# Altium footprint library connectors_USB_ETH.PcbLib: 71 footprints (part 1 of 5)
Each footprint in its own frame and in the unit in brackets; x right, y up, seen from the top. Pads: shape width x height; smd on the part's side, far side on the other; paste and mask are expansions set on the pad; w line width, h text height; cw(c..) or ccw(c..) is an arc to the next point about the centre after c.
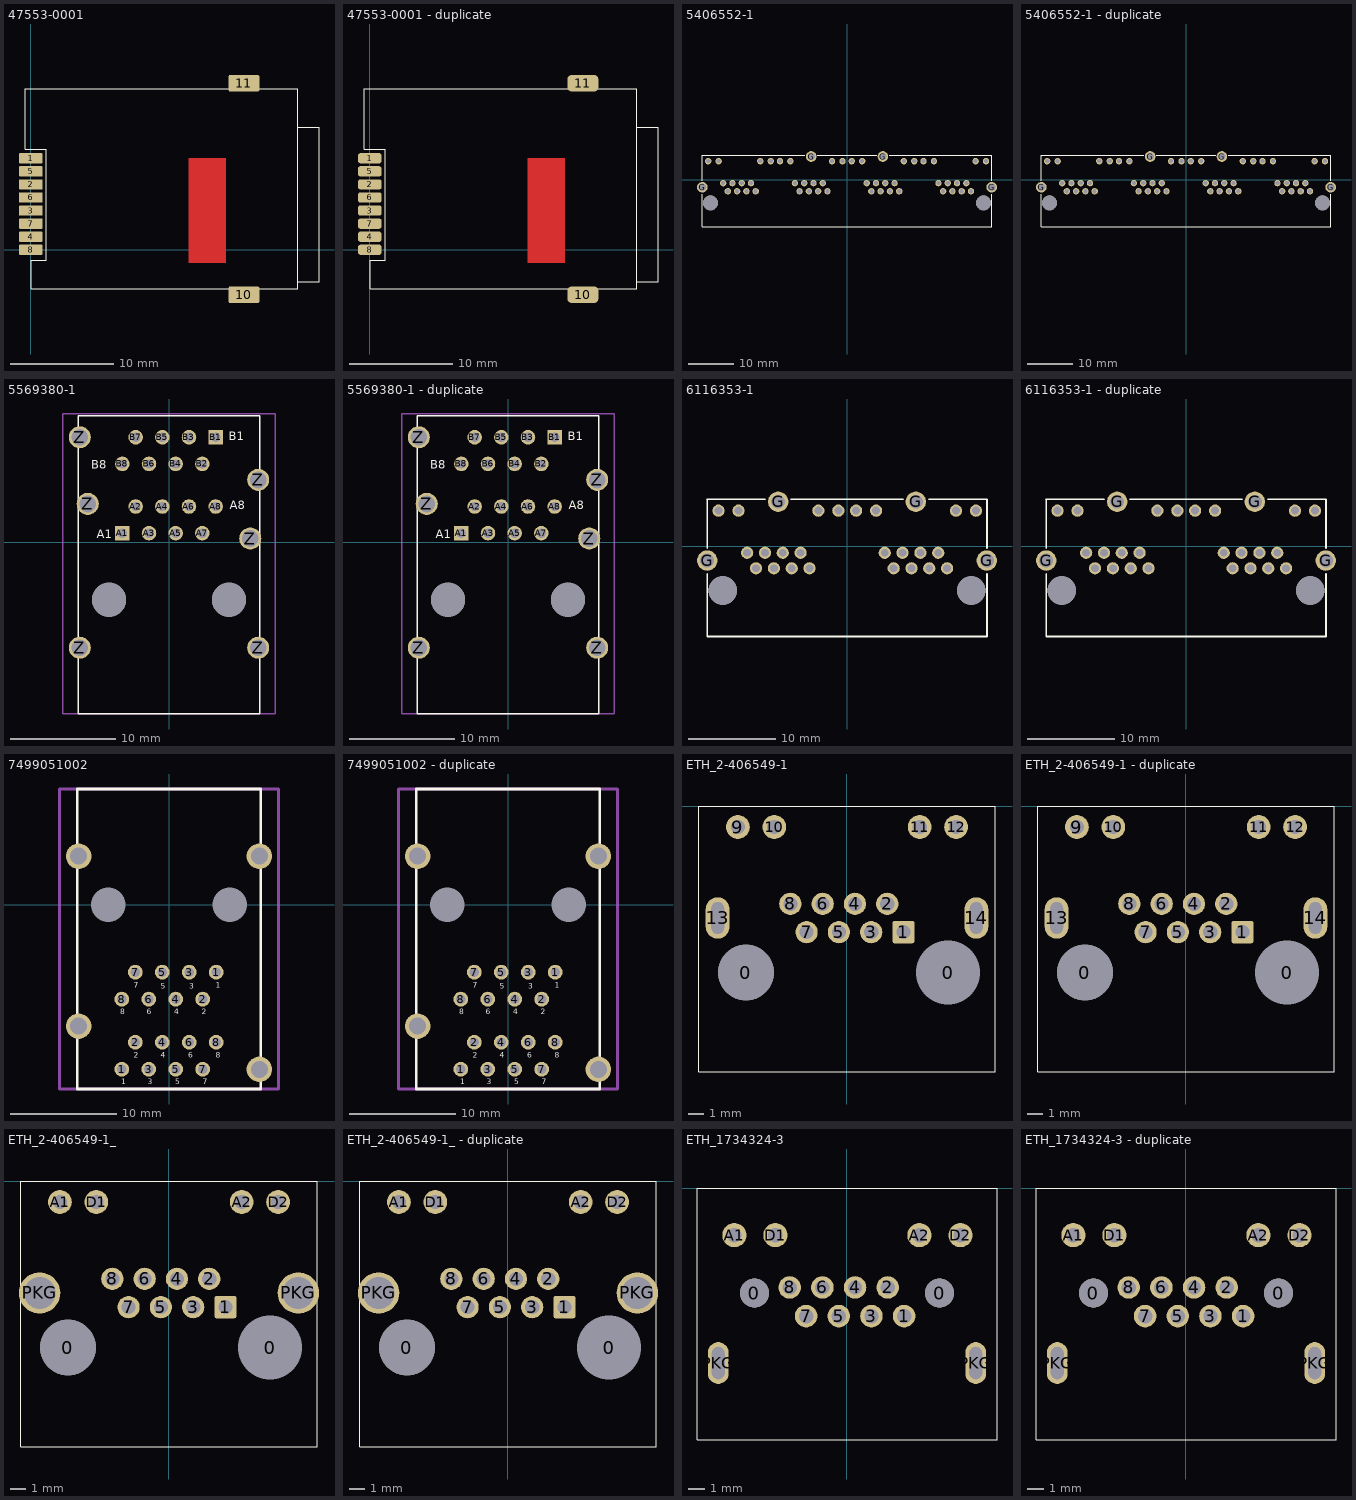
[diagram p0: the footprints below, top view; thin cyan lines are the x and y axes]

## 47553-0001 [mm]
pads (10):
  rrect20% 2.3x1 smd: 1(0,8.89) 2(0,6.35) 3(0,3.81) 4(0,1.27) 5(0,7.62) 6(0,5.08) 7(0,2.54) 8(0,0)
  rrect20% 3x1.6 smd: 10(20.7,-4.37) 11(20.7,16.18)
Top Layer:
  region: 15.367,-1.27 18.923,-1.27 18.923,8.89 15.367,8.89
Top Overlay:
  lines w0.1: 25.95,-3.1 28,-3.1 28,11.9 25.95,11.9 ; -0.55,9.75 1.5,9.75 1.5,-1 0.05,-1 0.05,-3.775 25.95,-3.775 25.95,15.65 -0.55,15.65 -0.55,9.75
3D body "SIM card.STEP": height 1.6, standoff 0.8, extent 3,-3.1 28,11.9
3D body "475530001.stp": height 1.84, standoff 0.01, extent -0.55,-4.525 25.95,16.425

## 47553-0001 - duplicate [mm]
pads (10):
  rrect50% 2.3x1 smd: 1(0,8.89) 2(0,6.35) 3(0,3.81) 4(0,1.27) 5(0,7.62) 6(0,5.08) 7(0,2.54) 8(0,0)
  rrect50% 3x1.6 smd: 10(20.7,-4.37) 11(20.7,16.18)
Top Layer:
  region: 15.367,-1.27 18.923,-1.27 18.923,8.89 15.367,8.89
Top Overlay:
  lines w0.1: 25.95,-3.1 28,-3.1 28,11.9 25.95,11.9 ; -0.55,9.75 -0.55,15.65 25.95,15.65 25.95,-3.775 0.05,-3.775 0.05,-1 1.5,-1 1.5,9.75 -0.55,9.75
3D body "475530001.stp": height 1.84, standoff 0.01, extent -0.55,-4.525 25.95,16.425
3D body "SIM card.STEP": height 1.6, standoff 0.8, extent 3,-3.1 28,11.9

## 5406552-1 [mm]
height 0.025
pads (54):
  round 1.4 hole 0.9 mask+0.127: 1_1(-20.04,-2.54) 1_2(-21.06,-0.76) 1_3(-22.08,-2.54) 1_4(-23.1,-0.76) 1_5(-24.12,-2.54) 1_6(-25.14,-0.76) 1_7(-26.16,-2.54) 1_8(-27.18,-0.76) 2_1(-4.29,-2.54) 2_2(-5.31,-0.76) 2_3(-6.33,-2.54) 2_4(-7.35,-0.76) 2_5(-8.37,-2.54) 2_6(-9.39,-0.76) 2_7(-10.41,-2.54) 2_8(-11.43,-0.76) 3_1(11.46,-2.54) 3_2(10.44,-0.76) 3_3(9.42,-2.54) 3_4(8.4,-0.76) 3_5(7.38,-2.54) 3_6(6.36,-0.76) 3_7(5.34,-2.54) 3_8(4.32,-0.76) 4_1(27.21,-2.54) 4_2(26.19,-0.76) 4_3(25.17,-2.54) 4_4(24.15,-0.76) 4_5(23.13,-2.54) 4_6(22.11,-0.76) 4_7(21.09,-2.54) 4_8(20.07,-0.76) GA1(-19.03,4.06) GA2(-3.28,4.06) GA3(12.47,4.06) GA4(28.22,4.06) GC1(-16.74,4.06) GC2(-0.99,4.06) GC3(14.76,4.06) GC4(30.51,4.06) YA1(-30.46,4.06) YA2(-14.71,4.06) YA3(1.04,4.06) YA4(16.79,4.06) YC1(-28.17,4.06) YC2(-12.42,4.06) YC3(3.33,4.06) YC4(19.08,4.06)
  round 2.337 hole 1.6 mask+0.102: G(-31.75,-1.65) G(-7.87,5.08) G(7.88,5.08) G(31.75,-1.65)
  round 3.251 / inner round 3.759 / far side round 3.251 hole 3.3 unplated: ""(-29.97,-5.08) ""(29.97,-5.08)
Top Overlay:
  lines w0.2: -31.74,-3.175 -31.74,-10.34 31.76,-10.34 31.76,-3.175 ; -31.74,-0.254 -31.74,5.36 -9.24,5.36 ; -6.54,5.38 6.56,5.38 ; 9.23,5.38 31.76,5.38 31.76,-0.254
3D body "4way_led-5406552-1-f-3d.stp": height 14.51, standoff -4.13, extent -32.965,-11.35 32.993,5.37

## 5406552-1 - duplicate [mm]
height 0.025
pads (54):
  round 1.4 hole 0.9 mask+0.127: 1_1(-20.04,-2.54) 1_2(-21.06,-0.76) 1_3(-22.08,-2.54) 1_4(-23.1,-0.76) 1_5(-24.12,-2.54) 1_6(-25.14,-0.76) 1_7(-26.16,-2.54) 1_8(-27.18,-0.76) 2_1(-4.29,-2.54) 2_2(-5.31,-0.76) 2_3(-6.33,-2.54) 2_4(-7.35,-0.76) 2_5(-8.37,-2.54) 2_6(-9.39,-0.76) 2_7(-10.41,-2.54) 2_8(-11.43,-0.76) 3_1(11.46,-2.54) 3_2(10.44,-0.76) 3_3(9.42,-2.54) 3_4(8.4,-0.76) 3_5(7.38,-2.54) 3_6(6.36,-0.76) 3_7(5.34,-2.54) 3_8(4.32,-0.76) 4_1(27.21,-2.54) 4_2(26.19,-0.76) 4_3(25.17,-2.54) 4_4(24.15,-0.76) 4_5(23.13,-2.54) 4_6(22.11,-0.76) 4_7(21.09,-2.54) 4_8(20.07,-0.76) GA1(-19.03,4.06) GA2(-3.28,4.06) GA3(12.47,4.06) GA4(28.22,4.06) GC1(-16.74,4.06) GC2(-0.99,4.06) GC3(14.76,4.06) GC4(30.51,4.06) YA1(-30.46,4.06) YA2(-14.71,4.06) YA3(1.04,4.06) YA4(16.79,4.06) YC1(-28.17,4.06) YC2(-12.42,4.06) YC3(3.33,4.06) YC4(19.08,4.06)
  round 2.337 hole 1.6 mask+0.102: G(-31.75,-1.65) G(-7.87,5.08) G(7.88,5.08) G(31.75,-1.65)
  round 3.251 / inner round 3.759 / far side round 3.251 hole 3.3 unplated: ""(-29.97,-5.08) ""(29.97,-5.08)
Top Overlay:
  lines w0.2: -31.74,-3.175 -31.74,-10.34 31.76,-10.34 31.76,-3.175 ; -31.74,-0.254 -31.74,5.36 -9.24,5.36 ; -6.54,5.38 6.56,5.38 ; 9.23,5.38 31.76,5.38 31.76,-0.254
3D body "4way_led-5406552-1-f-3d.stp": height 14.51, standoff -4.13, extent -32.965,-11.35 32.993,5.37

## 5569380-1 [mm] "Horizontal Shielded 2x1 TH  EMI  fingers  8P8C Tab Down & Up"
height 25.2
pads (24):
  rect 1.39x1.39 hole 0.89: A1(-4.445,0.89) B1(4.445,10.03)
  round 1.39 hole 0.89: A2(-3.175,3.43) A3(-1.905,0.89) A4(-0.635,3.43) A5(0.635,0.89) A6(1.905,3.43) A7(3.175,0.89) A8(4.445,3.43) B2(3.175,7.49) B3(1.905,10.03) B4(0.635,7.49) B5(-0.635,10.03) B6(-1.905,7.49) B7(-3.175,10.03) B8(-4.445,7.49)
  round 2.1 hole 1.6: Z(-8.505,-10.03) Z(-8.505,10.03) Z(-7.745,3.68) Z(7.745,0.38) Z(8.505,-10.03) Z(8.505,5.97)
  round 3.25 hole 3.25 unplated: ""(-5.715,-5.46) ""(5.715,-5.46)
Top Overlay:
  lines w0.127: -8.635,-16.35 -8.635,12.1 8.635,12.1 8.635,-16.35 -8.635,-16.35
  text "B8" at -7.4,7.025 h0.8
  text "B1" at 5.675,9.75 h0.8
  text "A8" at 5.8,3.15 h0.8
  text "A1" at -6.875,0.425 h0.8
Mechanical 15:
  lines w0.127: -10.136,-16.35 -10.136,12.25 10.136,12.25 10.136,-16.35 -10.136,-16.35
3D body "c-5569380-1-a1-3d.stp": height 25.39, standoff -4.07, extent -8.636,-16.248 8.636,12.2

## 5569380-1 - duplicate [mm] "Horizontal Shielded 2x1 TH  EMI  fingers  8P8C Tab Down & Up"
height 25.2
pads (24):
  rect 1.39x1.39 hole 0.89: A1(-4.445,0.89) B1(4.445,10.03)
  round 1.39 hole 0.89: A2(-3.175,3.43) A3(-1.905,0.89) A4(-0.635,3.43) A5(0.635,0.89) A6(1.905,3.43) A7(3.175,0.89) A8(4.445,3.43) B2(3.175,7.49) B3(1.905,10.03) B4(0.635,7.49) B5(-0.635,10.03) B6(-1.905,7.49) B7(-3.175,10.03) B8(-4.445,7.49)
  round 2.1 hole 1.6: Z(-8.505,-10.03) Z(-8.505,10.03) Z(-7.745,3.68) Z(7.745,0.38) Z(8.505,-10.03) Z(8.505,5.97)
  round 3.25 hole 3.25 unplated: ""(-5.715,-5.46) ""(5.715,-5.46)
Top Overlay:
  lines w0.127: -8.635,-16.35 -8.635,12.1 8.635,12.1 8.635,-16.35 -8.635,-16.35
  text "B8" at -7.4,7.025 h0.8
  text "B1" at 5.675,9.75 h0.8
  text "A8" at 5.8,3.15 h0.8
  text "A1" at -6.875,0.425 h0.8
Mechanical 15:
  lines w0.127: -10.136,-16.35 -10.136,12.25 10.136,12.25 10.136,-16.35 -10.136,-16.35
3D body "c-5569380-1-a1-3d.stp": height 25.39, standoff -4.07, extent -8.636,-16.248 8.636,12.2

## 6116353-1 [mm]
height 0.025
pads (30):
  round 1.4 hole 0.9 mask+0.127: 1_1(-4.29,-2.5) 1_2(-5.31,-0.72) 1_3(-6.33,-2.5) 1_4(-7.35,-0.72) 1_5(-8.37,-2.5) 1_6(-9.39,-0.72) 1_7(-10.41,-2.5) 1_8(-11.43,-0.72) 2_1(11.46,-2.5) 2_2(10.44,-0.72) 2_3(9.42,-2.5) 2_4(8.4,-0.72) 2_5(7.38,-2.5) 2_6(6.36,-0.72) 2_7(5.34,-2.5) 2_8(4.32,-0.72) GA1(-3.28,4.1) GA2(12.47,4.1) GC1(-0.99,4.1) GC2(14.76,4.1) YA1(-14.71,4.1) YA2(1.04,4.1) YC1(-12.42,4.1) YC2(3.33,4.1)
  round 2.337 hole 1.6 mask+0.102: G(-16,-1.61) G(-7.875,5.12) G(7.875,5.12) G(16,-1.61)
  round 3.251 / inner round 3.759 / far side round 3.251 hole 3.3 unplated: ""(-14.225,-5.04) ""(14.225,-5.04)
Top Overlay:
  lines w0.2: -16.01,5.4 -9.35,5.4 ; -15.99,-3.135 -15.99,-10.3 16.01,-10.3 16.01,-3.135 ; -15.99,-0.214 -15.99,5.4 ; -6.4,5.4 6.4,5.4 ; 9.35,5.4 16.01,5.4 16.01,-0.214
3D body "2way_led_6116353-1-d-3d.stp": height 14.66, standoff -4.06, extent -17.321,-11.321 17.321,5.4

## 6116353-1 - duplicate [mm]
height 0.025
pads (30):
  round 1.4 hole 0.9 mask+0.127: 1_1(-4.29,-2.5) 1_2(-5.31,-0.72) 1_3(-6.33,-2.5) 1_4(-7.35,-0.72) 1_5(-8.37,-2.5) 1_6(-9.39,-0.72) 1_7(-10.41,-2.5) 1_8(-11.43,-0.72) 2_1(11.46,-2.5) 2_2(10.44,-0.72) 2_3(9.42,-2.5) 2_4(8.4,-0.72) 2_5(7.38,-2.5) 2_6(6.36,-0.72) 2_7(5.34,-2.5) 2_8(4.32,-0.72) GA1(-3.28,4.1) GA2(12.47,4.1) GC1(-0.99,4.1) GC2(14.76,4.1) YA1(-14.71,4.1) YA2(1.04,4.1) YC1(-12.42,4.1) YC2(3.33,4.1)
  round 2.337 hole 1.6 mask+0.102: G(-16,-1.61) G(-7.875,5.12) G(7.875,5.12) G(16,-1.61)
  round 3.251 / inner round 3.759 / far side round 3.251 hole 3.3 unplated: ""(-14.225,-5.04) ""(14.225,-5.04)
Top Overlay:
  lines w0.2: -16.01,5.4 -9.35,5.4 ; -15.99,-3.135 -15.99,-10.3 16.01,-10.3 16.01,-3.135 ; -15.99,-0.214 -15.99,5.4 ; -6.4,5.4 6.4,5.4 ; 9.35,5.4 16.01,5.4 16.01,-0.214
3D body "2way_led_6116353-1-d-3d.stp": height 14.66, standoff -4.06, extent -17.321,-11.321 17.321,5.4

## 7499051002 [mm] "RJ45 LAN Transformer, 10/100/1000 Base-T Multiport & USB"
height 25.2
pads (22):
  round 1.4 hole 0.89: 1(-4.445,-15.49) 1(4.445,-6.35) 2(-3.175,-12.95) 2(3.175,-8.89) 3(-1.905,-15.49) 3(1.905,-6.35) 4(-0.635,-12.95) 4(0.635,-8.89) 5(-0.635,-6.35) 5(0.635,-15.49) 6(-1.905,-8.89) 6(1.905,-12.95) 7(-3.175,-6.35) 7(3.175,-15.49) 8(-4.445,-8.89) 8(4.445,-12.95)
  round 2.4 hole 1.6: ""(-8.51,-11.43) ""(-8.51,4.57) ""(8.51,-15.5) ""(8.51,4.57)
  rect 0x0 hole 3.25 unplated: ""(-5.715,0) ""(5.715,0)
Top Overlay:
  lines w0.254: -8.635,-17.35 8.635,-17.35 8.635,10.9 -8.635,10.9 -8.635,-17.35
  text "8" at 4.4,-14.4 h0.5
  text "8" at -4.6,-10.3 h0.5
  text "7" at 3.2,-16.9 h0.5
  text "7" at -3.3,-7.8 h0.5
  text "6" at 1.8,-14.4 h0.5
  text "6" at -2.1,-10.3 h0.5
  text "5" at 0.6,-16.9 h0.5
  text "5" at -0.8,-7.9 h0.5
  text "4" at -0.8,-14.4 h0.5
  text "4" at 0.5,-10.3 h0.5
  text "3" at -2,-16.9 h0.5
  text "3" at 1.9,-7.9 h0.5
  text "2" at -3.3,-14.4 h0.5
  text "2" at 3.1,-10.3 h0.5
  text "1" at -4.5,-16.9 h0.5
  text "1" at 4.4,-7.8 h0.5
Mechanical 15:
  lines w0.254: -10.306,-17.35 10.306,-17.35 10.306,10.9 -10.306,10.9 -10.306,-17.35
3D body "7499051002.stp": height 26.77, standoff -3.66, extent -10.271,-17.2 10.271,10.8

## 7499051002 - duplicate [mm] "RJ45 LAN Transformer, 10/100/1000 Base-T Multiport & USB"
height 25.2
pads (22):
  round 1.4 hole 0.89: 1(-4.445,-15.49) 1(4.445,-6.35) 2(-3.175,-12.95) 2(3.175,-8.89) 3(-1.905,-15.49) 3(1.905,-6.35) 4(-0.635,-12.95) 4(0.635,-8.89) 5(-0.635,-6.35) 5(0.635,-15.49) 6(-1.905,-8.89) 6(1.905,-12.95) 7(-3.175,-6.35) 7(3.175,-15.49) 8(-4.445,-8.89) 8(4.445,-12.95)
  round 2.4 hole 1.6: ""(-8.51,-11.43) ""(-8.51,4.57) ""(8.51,-15.5) ""(8.51,4.57)
  rect 0x0 hole 3.25 unplated: ""(-5.715,0) ""(5.715,0)
Top Overlay:
  lines w0.254: -8.635,-17.35 8.635,-17.35 8.635,10.9 -8.635,10.9 -8.635,-17.35
  text "8" at 4.4,-14.4 h0.5
  text "8" at -4.6,-10.3 h0.5
  text "7" at 3.2,-16.9 h0.5
  text "7" at -3.3,-7.8 h0.5
  text "6" at 1.8,-14.4 h0.5
  text "6" at -2.1,-10.3 h0.5
  text "5" at 0.6,-16.9 h0.5
  text "5" at -0.8,-7.9 h0.5
  text "4" at -0.8,-14.4 h0.5
  text "4" at 0.5,-10.3 h0.5
  text "3" at -2,-16.9 h0.5
  text "3" at 1.9,-7.9 h0.5
  text "2" at -3.3,-14.4 h0.5
  text "2" at 3.1,-10.3 h0.5
  text "1" at -4.5,-16.9 h0.5
  text "1" at 4.4,-7.8 h0.5
Mechanical 15:
  lines w0.254: -10.306,-17.35 10.306,-17.35 10.306,10.9 -10.306,10.9 -10.306,-17.35
3D body "7499051002.stp": height 26.77, standoff -3.66, extent -10.271,-17.2 10.271,10.8

## ETH_2-406549-1 [mm] "2-406549-1, 2-406549-4"
pads (16):
  round 3.5 hole 3.5: 0(-6.35,-10.47)
  round 3.5 hole 4: 0(6.35,-10.47)
  rrect20% 1.4x1.4 hole 0.89: 1(3.55,-7.93)
  round 1.4 hole 0.89: 2(2.53,-6.15) 3(1.52,-7.93) 4(0.5,-6.15) 5(-0.51,-7.93) 6(-1.53,-6.15) 7(-2.54,-7.93) 8(-3.56,-6.15)
  round 1.5 hole 0.89: 9(-6.86,-1.32) 10(-4.57,-1.32) 11(4.57,-1.32) 12(6.86,-1.32)
  oval 1.5x2.6 hole 0.8 slot 2 at 90 deg: 13(-8.13,-7.04) 14(8.13,-7.04)
Top Overlay:
  lines w0.05: -9.322,-16.721 -9.322,0 9.322,0 9.322,-16.721 -9.322,-16.721
3D body "c-2-406549-1-r1-3d.stp": height 14.7, standoff -4.02, extent -9.322,-16.721 9.322,0

## ETH_2-406549-1 - duplicate [mm] "2-406549-1, 2-406549-4"
pads (16):
  round 3.5 hole 3.5: 0(-6.35,-10.47)
  round 3.5 hole 4: 0(6.35,-10.47)
  rrect20% 1.4x1.4 hole 0.89: 1(3.55,-7.93)
  round 1.4 hole 0.89: 2(2.53,-6.15) 3(1.52,-7.93) 4(0.5,-6.15) 5(-0.51,-7.93) 6(-1.53,-6.15) 7(-2.54,-7.93) 8(-3.56,-6.15)
  round 1.5 hole 0.89: 9(-6.86,-1.32) 10(-4.57,-1.32) 11(4.57,-1.32) 12(6.86,-1.32)
  oval 1.5x2.6 hole 0.8 slot 2 at 90 deg: 13(-8.13,-7.04) 14(8.13,-7.04)
Top Overlay:
  lines w0.05: -9.322,-16.721 9.322,-16.721 9.322,0 -9.322,0 -9.322,-16.721
3D body "c-2-406549-1-r1-3d.stp": height 14.7, standoff -4.02, extent -9.322,-16.721 9.322,0

## ETH_2-406549-1_ [mm] "2-406549-1, 2-406549-4"
pads (16):
  round 3.5 hole 3.5: 0(-6.35,-10.47)
  round 3.5 hole 4: 0(6.35,-10.47)
  rrect20% 1.4x1.4 hole 0.89: 1(3.55,-7.93)
  round 1.4 hole 0.89: 2(2.53,-6.15) 3(1.52,-7.93) 4(0.5,-6.15) 5(-0.51,-7.93) 6(-1.53,-6.15) 7(-2.54,-7.93) 8(-3.56,-6.15)
  round 1.5 hole 0.89: A1(-6.86,-1.32) A2(4.57,-1.32) D1(-4.57,-1.32) D2(6.86,-1.32)
  round 2.6 hole 2: PKG(-8.13,-7.04) PKG(8.13,-7.04)
Top Overlay:
  lines w0.05: -9.322,-16.721 -9.322,0 9.322,0 9.322,-16.721 -9.322,-16.721
3D body "c-2-406549-1-r1-3d.stp": height 14.7, standoff -4.02, extent -9.322,-16.721 9.322,0

## ETH_2-406549-1_ - duplicate [mm] "2-406549-1, 2-406549-4"
pads (16):
  round 3.5 hole 3.5: 0(-6.35,-10.47)
  round 3.5 hole 4: 0(6.35,-10.47)
  rrect20% 1.4x1.4 hole 0.89: 1(3.55,-7.93)
  round 1.4 hole 0.89: 2(2.53,-6.15) 3(1.52,-7.93) 4(0.5,-6.15) 5(-0.51,-7.93) 6(-1.53,-6.15) 7(-2.54,-7.93) 8(-3.56,-6.15)
  round 1.5 hole 0.89: A1(-6.86,-1.32) A2(4.57,-1.32) D1(-4.57,-1.32) D2(6.86,-1.32)
  round 2.6 hole 2: PKG(-8.13,-7.04) PKG(8.13,-7.04)
Top Overlay:
  lines w0.05: -9.322,-16.721 9.322,-16.721 9.322,0 -9.322,0 -9.322,-16.721
3D body "c-2-406549-1-r1-3d.stp": height 14.7, standoff -4.02, extent -9.322,-16.721 9.322,0

## ETH_1734324-3 [mm] "1734324-3"
pads (16):
  round 1.8 hole 1.8: 0(-5.75,-6.5) 0(5.75,-6.5)
  round 1.4 hole 0.89: 1(3.55,-7.93) 2(2.53,-6.15) 3(1.52,-7.93) 4(0.5,-6.15) 5(-0.51,-7.93) 6(-1.53,-6.15) 7(-2.54,-7.93) 8(-3.56,-6.15)
  round 1.5 hole 0.89: A1(-7,-2.9) A2(4.5,-2.9) D1(-4.45,-2.9) D2(7.05,-2.9)
  oval 1.3x2.6 hole 0.8 slot 2 at 90 deg: PKG(-8,-10.85) PKG(8,-10.85)
Top Overlay:
  lines w0.05: -9.322,-15.6 9.322,-15.6 9.322,0 -9.322,0 -9.322,-15.6
3D body "c-1734324-3-a-3d.stp": height 11.35, standoff -2.15, extent -8.1,-15.6 8.1,-0.25

## ETH_1734324-3 - duplicate [mm] "1734324-3"
pads (16):
  round 1.8 hole 1.8: 0(-5.75,-6.5) 0(5.75,-6.5)
  round 1.4 hole 0.89: 1(3.55,-7.93) 2(2.53,-6.15) 3(1.52,-7.93) 4(0.5,-6.15) 5(-0.51,-7.93) 6(-1.53,-6.15) 7(-2.54,-7.93) 8(-3.56,-6.15)
  round 1.5 hole 0.89: A1(-7,-2.9) A2(4.5,-2.9) D1(-4.45,-2.9) D2(7.05,-2.9)
  oval 1.3x2.6 hole 0.8 slot 2 at 90 deg: PKG(-8,-10.85) PKG(8,-10.85)
Top Overlay:
  lines w0.05: -9.322,-15.6 9.322,-15.6 9.322,0 -9.322,0 -9.322,-15.6
3D body "c-1734324-3-a-3d.stp": height 11.35, standoff -2.15, extent -8.1,-15.6 8.1,-0.25